# Altium footprint library discret_ic.pcblib: 45 footprints (part 3 of 3)
Each footprint in its own frame and in the unit in brackets; x right, y up, seen from the top. Pads: shape width x height; smd on the part's side, far side on the other; paste and mask are expansions set on the pad; w line width, h text height; cw(c..) or ccw(c..) is an arc to the next point about the centre after c.
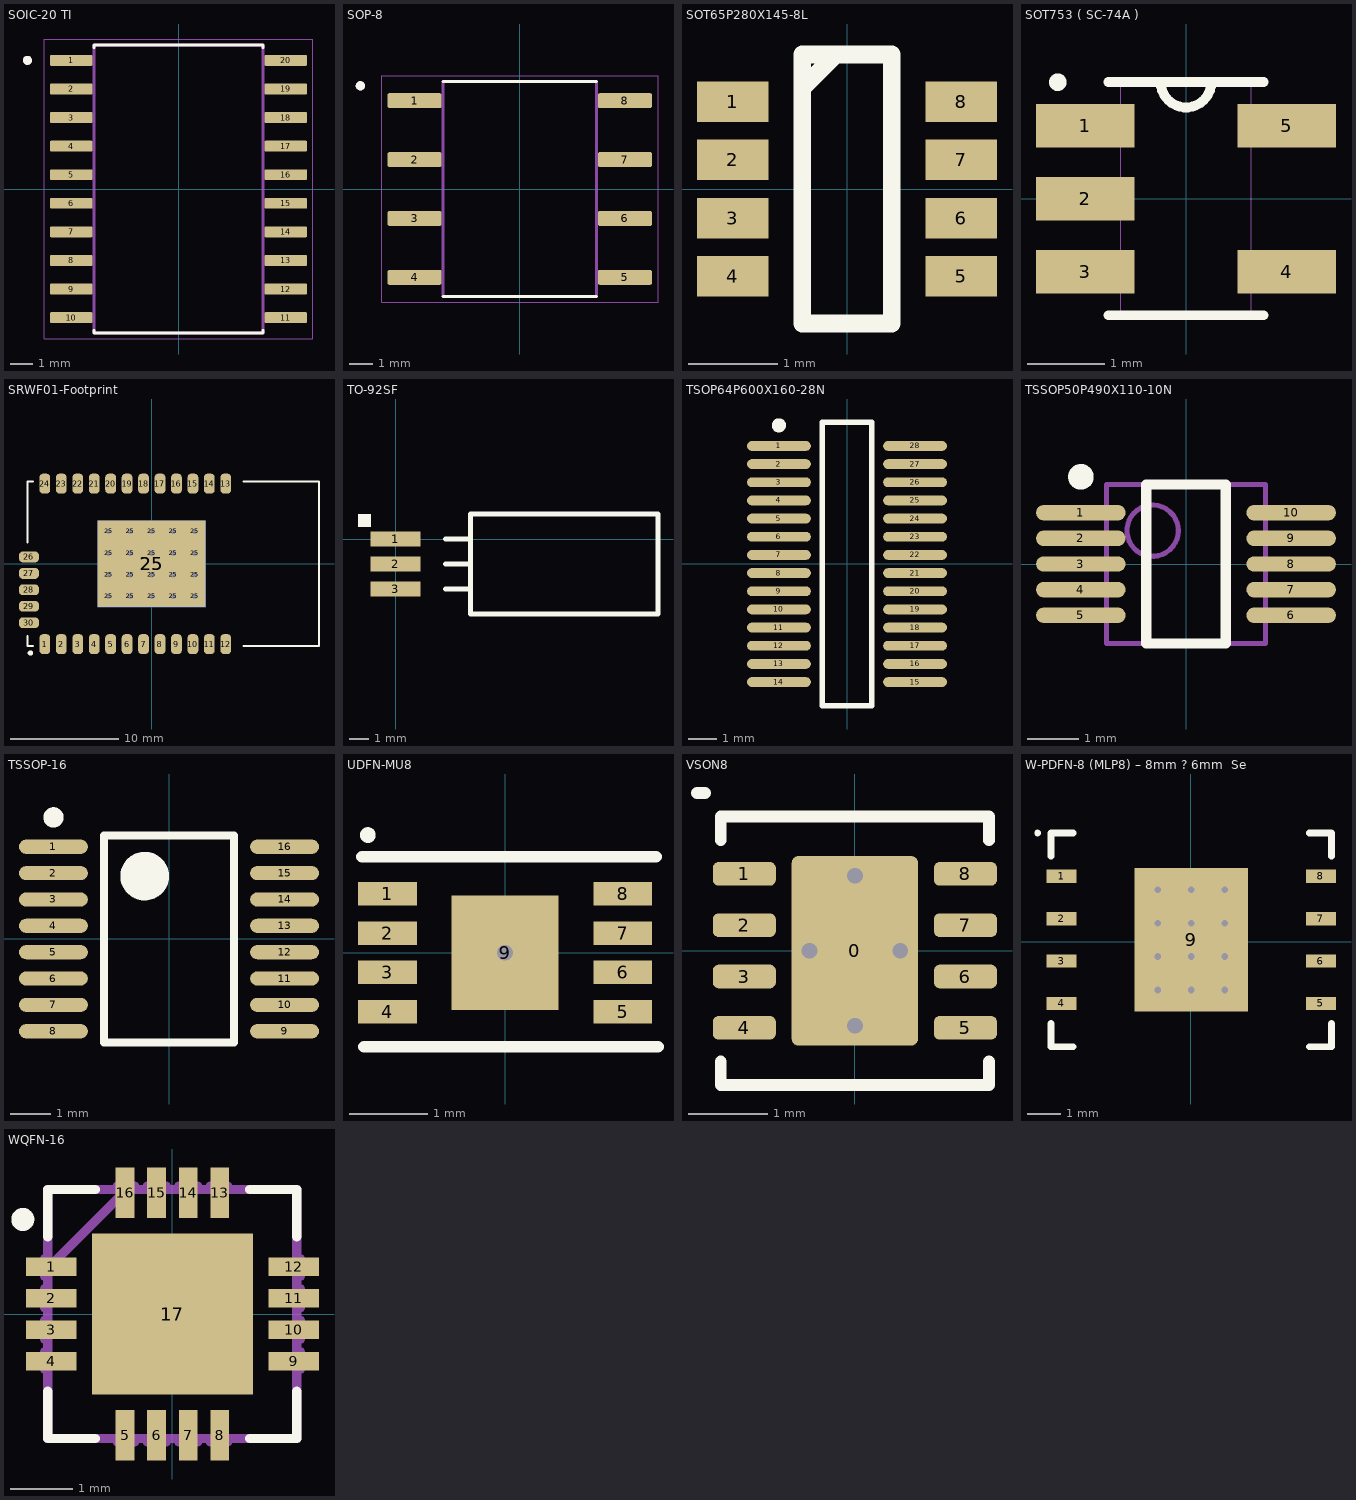
[diagram p2: the footprints below, top view; thin cyan lines are the x and y axes]

## SOIC-20 TI [mm]
pads (20):
  rrect25% 1.9x0.48 smd: 1(-4.765,5.715) 2(-4.765,4.445) 3(-4.765,3.175) 4(-4.765,1.905) 5(-4.765,0.635) 6(-4.765,-0.635) 7(-4.765,-1.905) 8(-4.765,-3.175) 9(-4.765,-4.445) 10(-4.765,-5.715) 11(4.765,-5.715) 12(4.765,-4.445) 13(4.765,-3.175) 14(4.765,-1.905) 15(4.765,-0.635) 16(4.765,0.635) 17(4.765,1.905) 18(4.765,3.175) 19(4.765,4.445) 20(4.765,5.715)
Top Overlay:
  circle w0.2: c-6.715,5.715 r0.1
  lines w0.127: -3.75,-6.275 -3.75,-6.4 3.75,-6.4 3.75,-6.275 ; -3.75,6.275 -3.75,6.4 3.75,6.4 3.75,6.275
Plata3D:
  circle w0.2: c-6.715,5.715 r0.1
  lines w0.127: -3.75,-6.4 3.75,-6.4 3.75,6.4 -3.75,6.4 -3.75,-6.4
Board3D:
  lines w0.05: -5.965,-6.65 5.965,-6.65 5.965,6.65 -5.965,6.65 -5.965,-6.65
3D body "CD74ACT540M.STEP": height 2.66, standoff 0.01, extent -5.15,-6.4 5.15,6.4

## SOP-8 [mm]
pads (8):
  rrect25% 2.34x0.64 smd: 1(-4.535,3.81) 2(-4.535,1.27) 3(-4.535,-1.27) 4(-4.535,-3.81) 5(4.535,-3.81) 6(4.535,-1.27) 7(4.535,1.27) 8(4.535,3.81)
Top Overlay:
  circle w0.2: c-6.875,4.45 r0.1
  lines w0.127: -3.31,-4.643 3.31,-4.643 ; -3.31,4.643 3.31,4.643
Plata3D:
  circle w0.2: c-6.875,4.45 r0.1
  lines w0.127: -3.31,-4.643 3.31,-4.643 3.31,4.643 -3.31,4.643 -3.31,-4.643
Board3D:
  lines w0.05: -5.96,-4.892 5.96,-4.892 5.96,4.892 -5.96,4.892 -5.96,-4.892
3D body "ISO1050DUBR--3DModel-STEP-56544.STEP": height 4.85, standoff 0, extent -5.2,-4.643 5.2,4.643

## SOT65P280X145-8L [mm] "SOT23, 8-Leads, Body 2.90x2.80mm, Pitch 0.65mm, IPC High Density"
height 1.45
pads (8):
  rect 0.8x0.45 smd: 1(-1.275,0.975) 2(-1.275,0.325) 3(-1.275,-0.325) 4(-1.275,-0.975) 5(1.275,-0.975) 6(1.275,-0.325) 7(1.275,0.325) 8(1.275,0.975)
Top Overlay:
  lines w0.2: -0.5,1.125 -0.125,1.5 ; -0.5,-1.5 -0.5,1.5 0.5,1.5 0.5,-1.5 -0.5,-1.5
3D body "sot23-8.STEP": height 1.2, standoff 0, extent -1.4,-1.47 1.4,1.47

## SOT753 ( SC-74A ) [mil]
pads (5):
  rect 50x22 smd: 1(-51,37) 2(-51,0) 3(-51,-37) 4(51,-37) 5(51,37)
Top Overlay:
  circle w5: c-64.96,59.06 r1.97
  lines w5: -39.37,-59.06 39.37,-59.06 ; -39.37,59.06 39.37,59.06 ; -12.8,59.06 ccw(c0,59.06) 12.8,59.06
Plata3D:
  lines w0: -33,-47 -59,-47 -59,-28 -33,-28 ; -33,-47 -33,-28 ; -33,-47 -33,-59 33,-59 33,-47 ; -33,-28 -33,-10 ; -33,-10 -59,-10 -59,10 -33,10 ; -33,-10 -33,10 ; -33,10 -33,28 ; -33,28 -59,28 -59,47 -33,47 ; -33,28 -33,47 ; -33,47 -33,59 -12,59 ; -12,59 ccw(c0,59) 12,59 ; -12,59 12,59 ; 12,59 33,59 33,47 ; 33,-47 59,-47 59,-28 33,-28 ; 33,-47 33,-28 ; 33,-28 33,28 ; 33,28 59,28 59,47 33,47 ; 33,28 33,47
3D body "NC7S32M5X.STEP": height 43.55, standoff 0.25, extent -54.13,-59.06 54.13,59.06

## SRWF01-Footprint [mm]
pads (51):
  rrect70% 1x1.85 smd: 1(-9.9,-7.435) 2(-8.376,-7.435) 3(-6.852,-7.435) 4(-5.328,-7.435) 5(-3.804,-7.435) 6(-2.28,-7.435) 7(-0.756,-7.435) 8(0.768,-7.435) 9(2.292,-7.435) 10(3.816,-7.435) 11(5.34,-7.435) 12(6.864,-7.435) 13(6.864,7.435) 14(5.34,7.435) 15(3.816,7.435) 16(2.292,7.435) 17(0.768,7.435) 18(-0.756,7.435) 19(-2.28,7.435) 20(-3.804,7.435) 21(-5.328,7.435) 22(-6.852,7.435) 23(-8.376,7.435) 24(-9.9,7.435)
  round 1 hole 0.5 mask+0: 25(-4,-3) 25(-4,-1) 25(-4,1) 25(-4,3) 25(-2,-3) 25(-2,-1) 25(-2,1) 25(-2,3) 25(0,-3) 25(0,-1) 25(0,1) 25(0,3) 25(2,-3) 25(2,-1) 25(2,1) 25(2,3) 25(4,-3) 25(4,-1) 25(4,1) 25(4,3)
  rect 10x8 smd mask+0: 25(0,0)
  rect 10x8 smd far side mask+0: 25(0,0)
  rrect70% 1.85x1 smd: 26(-11.37,0.641) 27(-11.37,-0.883) 28(-11.37,-2.407) 29(-11.37,-3.931) 30(-11.37,-5.455)
Top Overlay:
  circle w0.25: c-11.24,-8.259 r0.125
  lines w0.2: -11.5,-6.7 -11.5,-7.62 -11,-7.62 ; -11.5,2 -11.5,7.62 -11,7.62 ; 8.5,-7.62 15.5,-7.62 15.5,0 15.5,7.62 8.5,7.62
3D body "User Library-SPWF01SA.step": height 2.35, standoff -0.01, extent -11.55,-7.6 15.374,7.64

## TO-92SF [mil]
pads (3):
  rect 100x30 smd: 1(0,0) 2(0,-50) 3(0,-100)
Top Overlay:
  region: -75,25 -50,25 -50,50 -75,50
  lines w10: 100,-100 150,-100 ; 100,-50 150,-50 ; 100,0 150,0 ; 150,-150 150,50 525,50 525,-150 150,-150
3D body "humidity sensor2.stp": height 79.92, standoff 0, extent -49.61,-133.66 520.08,34.45

## TSOP64P600X160-28N [mm] "TSOP, 28-Leads, Body 9,90x3,90mm, Pitch 0,64mm, IPC Medium Density"
height 1.6
pads (28):
  oval 2.25x0.35 smd: 1(-2.4,4.16) 2(-2.4,3.52) 3(-2.4,2.88) 4(-2.4,2.24) 5(-2.4,1.6) 6(-2.4,0.96) 7(-2.4,0.32) 8(-2.4,-0.32) 9(-2.4,-0.96) 10(-2.4,-1.6) 11(-2.4,-2.24) 12(-2.4,-2.88) 13(-2.4,-3.52) 14(-2.4,-4.16) 15(2.4,-4.16) 16(2.4,-3.52) 17(2.4,-2.88) 18(2.4,-2.24) 19(2.4,-1.6) 20(2.4,-0.96) 21(2.4,-0.32) 22(2.4,0.32) 23(2.4,0.96) 24(2.4,1.6) 25(2.4,2.24) 26(2.4,2.88) 27(2.4,3.52) 28(2.4,4.16)
Top Overlay:
  circle w0.25: c-2.4,4.885 r0.125
  lines w0.2: -0.875,-5 -0.875,5 0.875,5 0.875,-5 -0.875,-5
3D body "User Library-SSOP28_LTC1923.STEP": height 1.75, standoff 0, extent -3.094,-4.991 3.094,4.991

## TSSOP50P490X110-10N [mm] "TSSOP, 10-Leads, Body 3,00x3,00mm, Pitch 0,50mm, IPC Medium Density"
height 1.1
pads (10):
  oval 1.75x0.3 smd: 1(-2.05,1) 2(-2.05,0.5) 3(-2.05,0) 4(-2.05,-0.5) 5(-2.05,-1) 6(2.05,-1) 7(2.05,-0.5) 8(2.05,0) 9(2.05,0.5) 10(2.05,1)
Top Overlay:
  circle w0.25: c-2.05,1.7 r0.125
  lines w0.2: -0.775,-1.55 -0.775,1.55 0.775,1.55 0.775,-1.55 -0.775,-1.55
Plata3D:
  circle w0.1: c-0.65,0.65 r0.5
  lines w0.1: -1.55,-1.55 -1.55,1.55 1.55,1.55 1.55,-1.55 -1.55,-1.55
3D body: height 1.1, standoff 0.13, extent -1.55,-1.55 1.55,1.55

## TSSOP-16 [mm]
pads (16):
  oval 1.7x0.35 smd: 1(-2.85,2.275) 2(-2.85,1.625) 3(-2.85,0.975) 4(-2.85,0.325) 5(-2.85,-0.325) 6(-2.85,-0.975) 7(-2.85,-1.625) 8(-2.85,-2.275) 9(2.85,-2.275) 10(2.85,-1.625) 11(2.85,-0.975) 12(2.85,-0.325) 13(2.85,0.325) 14(2.85,0.975) 15(2.85,1.625) 16(2.85,2.275)
Top Overlay:
  circle w0.25: c-2.85,3 r0.125
  circle w0.6: c-0.6,1.55 r0.3
  lines w0.2: -1.6,-2.55 -1.6,2.55 1.6,2.55 1.6,-2.55 -1.6,-2.55
3D body "User Library-tssop16-2.step": height 1.2, standoff 0, extent -3.2,-2.55 3.2,2.55

## UDFN-MU8 [mm] "SON, 8-Leads, Body 2x3mm, Pitch 0.5mm, Microchip Recommended"
height 0.55
pads (9):
  rect 0.75x0.3 smd: 1(-1.5,0.75) 2(-1.5,0.25) 3(-1.5,-0.25) 4(-1.5,-0.75) 5(1.5,-0.75) 6(1.5,-0.25) 7(1.5,0.25) 8(1.5,0.75)
  rect 1.36x1.46 smd: 9(0,0)
via 0,0 diameter 0.5 hole 0.2
Top Overlay:
  circle w0.1: c-1.75,1.5 r0.05
  lines w0.15: -1.825,1.225 1.925,1.225 ; -1.8,-1.2 1.95,-1.2
3D body: height 0.55, standoff 0, extent -1.524,-1.024 1.524,1.024

## VSON8 [mm] "VSON8"
pads (9):
  rrect10% 1.6x2.4 smd mask+0.07: 0(0,0)
  rrect50% 0.8x0.3 smd mask+0.07: 1(-1.4,0.975) 2(-1.4,0.325) 3(-1.4,-0.325) 4(-1.4,-0.975) 5(1.4,-0.975) 6(1.4,-0.325) 7(1.4,0.325) 8(1.4,0.975)
via 0.575,0 diameter 0.4 hole 0.2
via -0.575,0 diameter 0.4 hole 0.2
via 0,0.95 diameter 0.4 hole 0.2
via 0,-0.95 diameter 0.4 hole 0.2
Top Overlay:
  lines w0.15: -2,2 -1.9,2 ; -1.7,-1.4 -1.7,-1.7 1.7,-1.7 1.7,-1.4 ; -1.7,1.4 -1.7,1.7 1.7,1.7 1.7,1.4
3D body "User Library-SON8_3mm.step": height 1, standoff 0, extent -1.575,-1.575 1.575,1.575

## W-PDFN-8 (MLP8) – 8mm ? 6mm  Se [mm]
pads (9):
  rect 0.9x0.4 smd: 1(-3.872,1.955) 2(-3.872,0.685) 3(-3.872,-0.585) 4(-3.872,-1.855) 5(3.898,-1.855) 6(3.898,-0.585) 7(3.898,0.685) 8(3.898,1.955)
  rect 3.4x4.3 smd paste-1.7: 9(0.013,0.05)
via 1.013,-1.45 diameter 0.5 hole 0.2
via 0.013,-1.45 diameter 0.5 hole 0.2
via -0.987,-1.45 diameter 0.5 hole 0.2
via 1.013,-0.45 diameter 0.5 hole 0.2
via 0.013,-0.45 diameter 0.5 hole 0.2
via -0.987,-0.45 diameter 0.5 hole 0.2
via 0.013,1.55 diameter 0.5 hole 0.2
via -0.987,1.55 diameter 0.5 hole 0.2
via 1.013,1.55 diameter 0.5 hole 0.2
via -0.987,0.55 diameter 0.5 hole 0.2
via 0.013,0.55 diameter 0.5 hole 0.2
via 1.013,0.55 diameter 0.5 hole 0.2
Top Overlay:
  circle w0.1: c-4.587,3.25 r0.05
  lines w0.2: -4.187,-2.455 -4.187,-3.15 -3.522,-3.15 ; -4.187,2.555 -4.187,3.25 -3.522,3.25 ; 3.548,-3.15 4.213,-3.15 4.213,-2.455 ; 3.548,3.25 4.213,3.25 4.213,2.555
Top Paste:
  rectangle: 0.678,-1.995 1.608,-0.765
  rectangle: 0.678,-0.565 1.608,0.665
  rectangle: 0.678,0.865 1.608,2.095
  rectangle: -0.452,-1.995 0.478,-0.765
  rectangle: -0.452,-0.565 0.478,0.665
  rectangle: -0.452,0.865 0.478,2.095
  rectangle: -1.581,-1.995 -0.651,-0.765
  rectangle: -1.581,-0.565 -0.651,0.665
  rectangle: -1.581,0.865 -0.651,2.095
3D body "SON127P800X75_HS-9N.step": height 0.75, standoff 0, extent -4.037,-3 4.063,3.1

## WQFN-16 [mil]
pads (17):
  rect 32x12 smd: 1(-77,30) 2(-77,10) 3(-77,-10) 4(-77,-30) 9(77,-30) 10(77,-10) 11(77,10) 12(77,30)
  rect 12x32 smd: 5(-30,-77) 6(-10,-77) 7(10,-77) 8(30,-77) 13(30,77) 14(10,77) 15(-10,77) 16(-30,77)
  rect 102x102 smd: 17(0,0)
Top Overlay:
  circle w9.84: c-95,60 r2.38
  lines w6: -79,-49 -79,-79 -49,-79 ; -79,49 -79,79 -49,79 ; 49,-79 79,-79 79,-49 ; 49,79 79,79 79,49
Plata3D:
  lines w6: -79,29 -29,79 ; -81,-35 -81,-24 -79,-24 -79,-35 -81,-35 ; -81,-16 -81,-4 -79,-4 -79,-16 -81,-16 ; -81,4 -81,16 -79,16 -79,4 -81,4 ; -81,24 -81,35 -79,35 -79,24 -81,24 ; -79,-79 79,-79 79,79 -79,79 -79,-79 ; -35,-81 -35,-79 -24,-79 -24,-81 -35,-81 ; -35,79 -24,79 -24,81 -35,81 -35,79 ; -16,-81 -16,-79 -4,-79 -4,-81 -16,-81 ; -16,79 -4,79 -4,81 -16,81 -16,79 ; 4,-81 4,-79 16,-79 16,-81 4,-81 ; 4,79 16,79 16,81 4,81 4,79 ; 24,-81 24,-79 35,-79 35,-81 24,-81 ; 24,79 35,79 35,81 24,81 24,79 ; 79,-35 79,-24 81,-24 81,-35 79,-35 ; 79,-16 79,-4 81,-4 81,-16 79,-16 ; 79,4 79,16 81,16 81,4 79,4 ; 79,24 79,35 81,35 81,24 79,24
3D body "WQFN-16.STEP": height 32, standoff 0.5, extent -78.74,-78.74 78.74,78.74